# Altium footprint library Conectors.PcbLib: 123 footprints (part 8 of 8)
Each footprint in its own frame and in the unit in brackets; x right, y up, seen from the top. Pads: shape width x height; smd on the part's side, far side on the other; paste and mask are expansions set on the pad; w line width, h text height; cw(c..) or ccw(c..) is an arc to the next point about the centre after c.
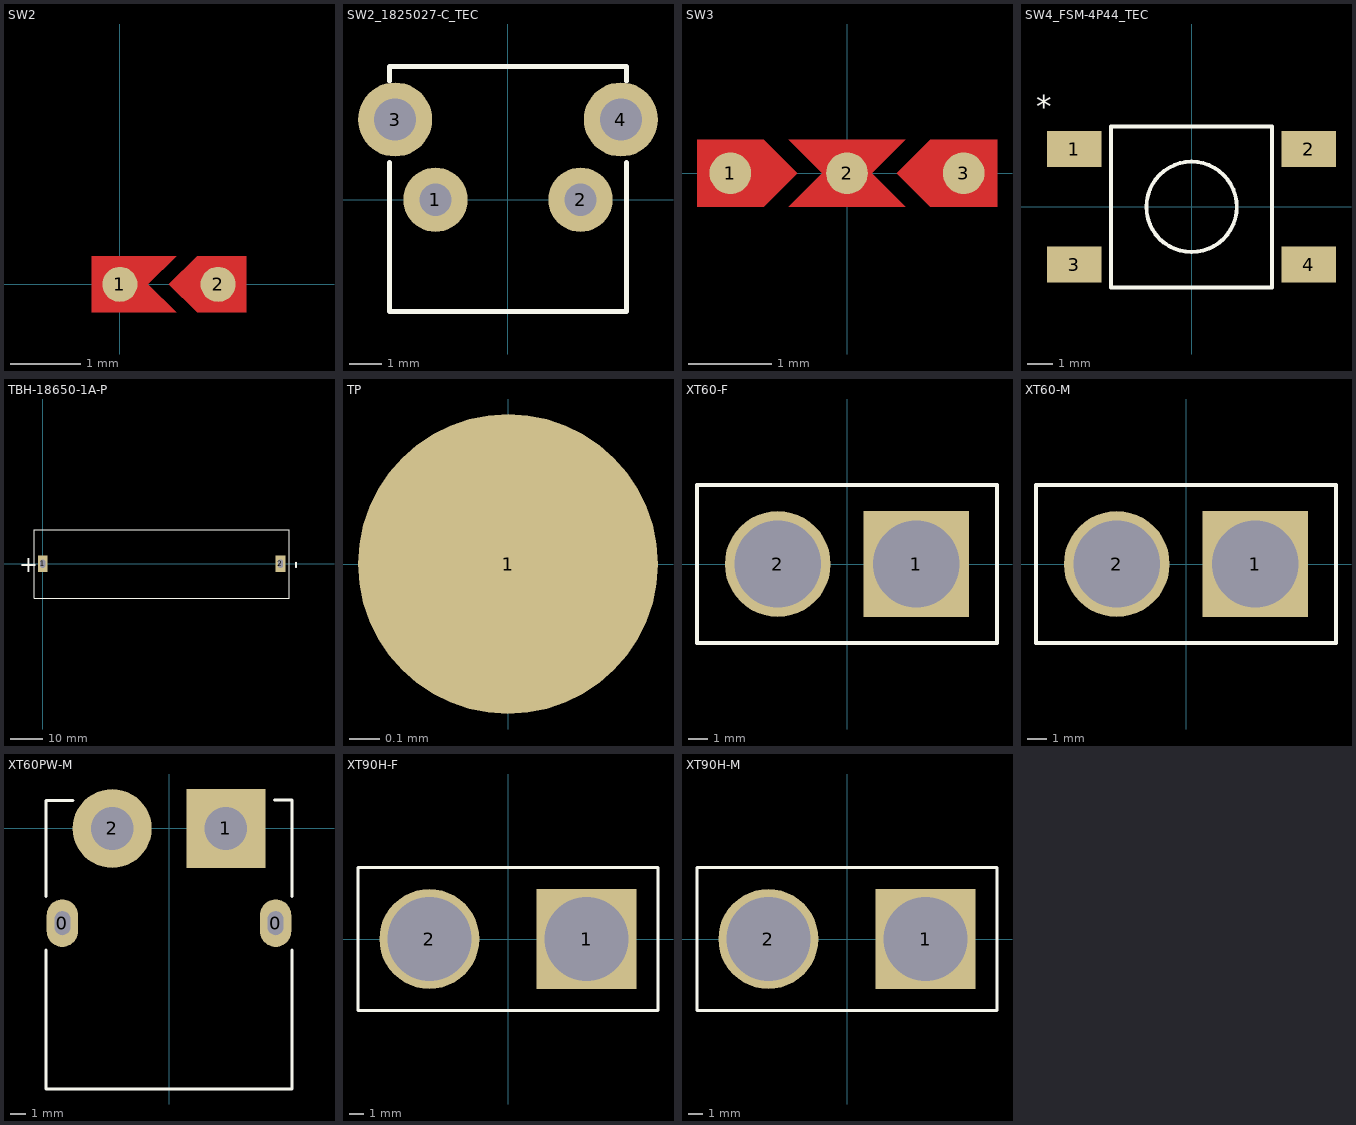
[diagram p7: the footprints below, top view; thin cyan lines are the x and y axes]

## SW2 [mm]
pads (2):
  round 0.5 smd paste+0 mask+0: 1(0,0) 2(1.4,0)
Top Layer:
  region: 0.3,2.4
  region: 1.1,0.4 0.7,0 1.1,-0.4 1.8,-0.4 1.8,0.4
  region: -0.4,0.4 -0.4,-0.4 0.8,-0.4 0.4,0 0.8,0.4
Top Overlay:
  region: 1.075,-0.78
  region: -0.025,3.5
  region: 0.15,3.175
  region: 0.525,3.5

## SW2_1825027-C_TEC [mm]
pads (4):
  round 2 hole 1: 1(-2.25,0) 2(2.25,0)
  round 2.3 hole 1.3 mask+0: 3(-3.505,2.49) 4(3.505,2.49)
Top Overlay:
  lines w0.152: -3.683,1.156 -3.683,-3.47 3.683,-3.47 3.683,1.156 ; -3.683,3.683 -3.683,4.137 3.683,4.137 3.683,3.683
3D body "c-1825027-8-g-3d.stp": height 7, standoff -3.52, extent -4.204,-5.842 4.204,4

## SW3 [mm]
pads (3):
  round 0.5 smd paste+0 mask+0: 1(-1.4,0) 2(0,0) 3(1.4,0)
Top Layer:
  region: -0.2,0.4 -0.2,-0.4 0.7,-0.4 0.3,0 0.7,0.4
  region: -1,-0.4 -0.6,0 -1,0.4 -1.8,0.4 -1.8,-0.4
  region: 1,0.4 0.6,0 1,-0.4 1.8,-0.4 1.8,0.4
  region: 0.2,-0.4 0.2,0.4 -0.7,0.4 -0.3,0 -0.7,-0.4
Top Overlay:
  region: 1.125,-0.78

## SW4_FSM-4P44_TEC [mil]
pads (4):
  rect 83x55 smd paste+0 mask+0: 1(-179,88) 2(179,88) 3(-179,-88) 4(179,-88)
Top Overlay:
  circle w6: c0,0 r69
  lines w6: -123,-123 123,-123 123,123 -123,123 -123,-123
  text "*" at -237.5,125 h59.06
3D body "c-2-1437565-7-v-3d.stp": height 173.62, standoff 1.18, extent -196.86,-118.1 196.84,118.12

## TBH-18650-1A-P [mm]
pads (2):
  rect 3x5 hole 2.5 slot 1.5 at 0 deg: 1(0,0) 2(72.5,0)
Top Overlay:
  lines w0.254: -2.642,-10.561 75.058,-10.561 75.111,-10.508 75.111,10.339 -2.642,10.339 -2.642,-10.561
  text "-" at 79.245,-1.746 h5
  text "+" at -7.246,-2.579 h5
3D body "User Library-18650 Full.STEP": height 21.65, standoff -3.83, extent -2.515,-10.4 75.135,10.4

## TP [mm]
pads (1):
  round 1 smd: 1(0,0)

## XT60-F [mm]
pads (2):
  rect 5.5x5.5 hole 4.5: 1(3.6,0)
  round 5.5 hole 4.5: 2(-3.6,0)
Top Overlay:
  lines w0.2: -7.8,-4.1 -7.8,4.1 7.8,4.1 7.8,-4.1 -7.8,-4.1
3D body "XT-60_F.STEP": height 16.6, standoff -4.9, extent -8.15,-4.1 8.15,4.1

## XT60-M [mm]
pads (2):
  rect 5.5x5.5 hole 4.5: 1(3.6,0)
  round 5.5 hole 4.5: 2(-3.6,0)
Top Overlay:
  lines w0.2: -7.8,-4.1 -7.8,4.1 7.8,4.1 7.8,-4.1 -7.8,-4.1
3D body "XT-60_M.STEP": height 16.2, standoff -5, extent -8.15,-4.1 8.15,4.1

## XT60PW-M [mm]
pads (4):
  oval 2x3 hole 1 slot 1.5 at 90 deg: 0(-6.75,-6) 0(6.75,-6)
  rect 5x5 hole 2.7: 1(3.6,0)
  round 5 hole 2.7: 2(-3.6,0)
Top Overlay:
  lines w0.2: -7.8,-7.7 -7.8,-16.5 7.8,-16.5 7.8,-7.7 ; -7.8,-4.3 -7.8,1.768 -6.1,1.768 ; 6.7,1.8 7.8,1.8 7.8,-4.3
3D body "XT60PW-M.STEP": height 8.4, standoff -2.2, extent -7.75,-16.5 7.75,1.7

## XT90H-F [mm]
pads (2):
  rect 7x7 hole 5.9: 1(5.5,0)
  round 7 hole 5.9: 2(-5.5,0)
Top Overlay:
  lines w0.2: -10.5,-5 10.5,-5 10.5,5 -10.5,5 -10.5,-5
3D body "XT90H-F SBORKA.STEP": height 20.2, standoff -4.1, extent -10.7,-5.4 10.7,5.4

## XT90H-M [mm]
pads (2):
  rect 7x7 hole 5.9: 1(5.5,0)
  round 7 hole 5.9: 2(-5.5,0)
Top Overlay:
  lines w0.2: -10.5,-5 10.5,-5 10.5,5 -10.5,5 -10.5,-5
3D body "XT90H-M SBORKA.STEP": height 21.3, standoff -4.9, extent -10.5,-5.4 10.5,5.4